# Altium integrated library LEMO Unipole And Multipole Type Connectors.IntLib: 1566 symbols (part 2 of 13) (continued)
## EDP.3M.322.XLN (continued)
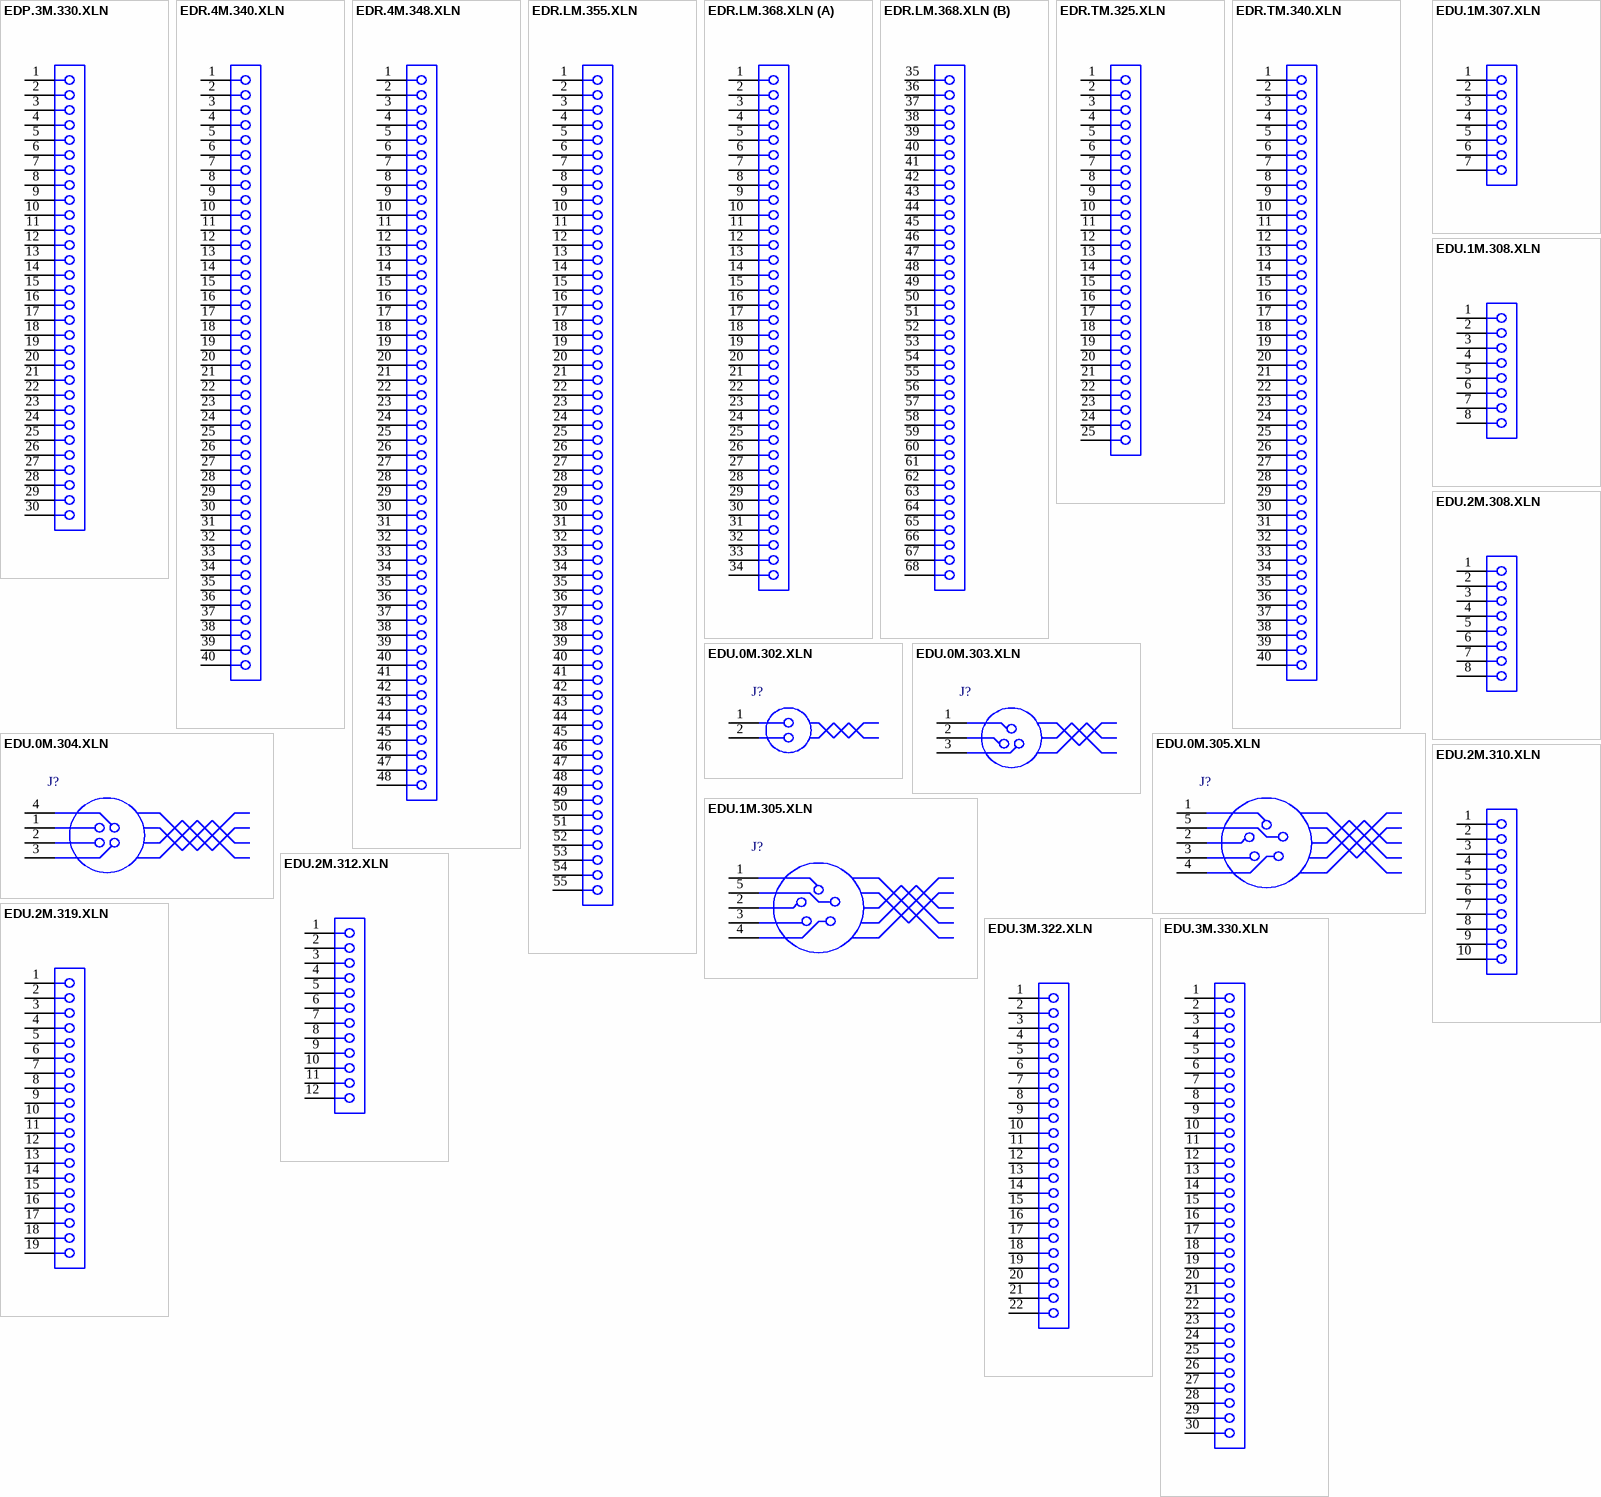
[diagram p6: symbols EDP.3M.330.XLN to EDU.3M.330.XLN]

## EDP.3M.330.XLN
designator J?
Fixed receptacle with square flange, Key (P), 3M series, Multipole Type with 30 Contacts; Manufacturer: LEMO; PartNumber: EDP.3M.330.XLN; Number of contacts: 30; Contact Diameter: 0.7 mm; AWG: 24; Rated Current(A): 3.5; DatasheetVersion: Jun-14; PackageReference: EDP.3M.330.XLN; PackageDescription: Fixed receptacle with square flange, Key(P) for Printed Circuit; ComponentLink1Description: Manufacturer URL; ComponentLink1URL: http://www.lemo.com; ComponentLink2Description: Datasheet; ComponentLink2URL: http://intra.lemo.ch/catalog/ROW/UK_English/M_series.pdf
footprint EDP.3M.330.XLN (Socket, Female, Height 22.1 mm, Through hole)
pins: 1, 2, 3, 4, 5, 6, 7, 8, 9, 10, 11, 12, 13, 14, 15, 16, 17, 18, 19, 20, 21, 22, 23, 24, 25, 26, 27, 28, 29, 30

## EDR.4M.340.XLN
designator J?
Fixed receptacle with square flange, Key (R), 4M series, Multipole Type with 40 Contacts; Manufacturer: LEMO; PartNumber: EDR.4M.340.XLN; Number of contacts: 40; Contact Diameter: 0.7 mm; AWG: 24; Rated Current(A): 3.5; DatasheetVersion: Jun-14; PackageReference: EDR.4M.340.XLN; PackageDescription: Fixed receptacle with square flange, Key(R) for Printed Circuit; ComponentLink1Description: Manufacturer URL; ComponentLink1URL: http://www.lemo.com; ComponentLink2Description: Datasheet; ComponentLink2URL: http://intra.lemo.ch/catalog/ROW/UK_English/M_series.pdf
footprint EDR.4M.340.XLN (Socket, Female, Through hole)
pins: 1, 2, 3, 4, 5, 6, 7, 8, 9, 10, 11, 12, 13, 14, 15, 16, 17, 18, 19, 20, 21, 22, 23, 24, 25, 26, 27, 28, 29, 30, 31, 32, 33, 34, 35, 36, 37, 38, 39, 40

## EDR.4M.348.XLN
designator J?
Fixed receptacle with square flange, Key (R), 4M series, Multipole Type with 48 Contacts; Manufacturer: LEMO; PartNumber: EDR.4M.348.XLN; Number of contacts: 48; Contact Diameter: 0.7 mm; AWG: 24; Rated Current(A): 3; DatasheetVersion: Jun-14; PackageReference: EDR.4M.348.XLN; PackageDescription: Fixed receptacle with square flange, Key(R) for Printed Circuit; ComponentLink1Description: Manufacturer URL; ComponentLink1URL: http://www.lemo.com; ComponentLink2Description: Datasheet; ComponentLink2URL: http://intra.lemo.ch/catalog/ROW/UK_English/M_series.pdf
footprint EDR.4M.348.XLN (Socket, Female, Through hole)
pins: 1, 2, 3, 4, 5, 6, 7, 8, 9, 10, 11, 12, 13, 14, 15, 16, 17, 18, 19, 20, 21, 22, 23, 24, 25, 26, 27, 28, 29, 30, 31, 32, 33, 34, 35, 36, 37, 38, 39, 40, 41, 42, 43, 44, 45, 46, 47, 48

## EDR.LM.355.XLN
designator J?
Fixed receptacle with square flange, Key (R), LM series, Multipole Type with; Manufacturer: LEMO; PartNumber: EDR.LM.355.XLN; Number of contacts: 0; Contact Diameter: 0.9 mm; Rated Current(A): 3.5; DatasheetVersion: Jun-14; PackageReference: EDR.LM.355.XLN; PackageDescription: Fixed receptacle with square flange, Key(R) for Printed Circuit; AWG: 0; ComponentLink1Description: Manufacturer URL; ComponentLink1URL: http://www.lemo.com; ComponentLink2Description: Datasheet; ComponentLink2URL: http://intra.lemo.ch/catalog/ROW/UK_English/M_series.pdf
footprint EDR.LM.355.XLN (Socket, Female, Height 28.5 mm, Through hole)
pins: 1, 2, 3, 4, 5, 6, 7, 8, 9, 10, 11, 12, 13, 14, 15, 16, 17, 18, 19, 20, 21, 22, 23, 24, 25, 26, 27, 28, 29, 30, 31, 32, 33, 34, 35, 36, 37, 38, 39, 40, 41, 42, 43, 44, 45, 46, 47, 48, 49, 50, 51, 52, 53, 54, 55

## EDR.LM.368.XLN
designator J?
Fixed receptacle with square flange, Key (R), LM series, Multipole Type with; Manufacturer: LEMO; PartNumber: EDR.LM.368.XLN; Number of contacts: 0; Contact Diameter: 0.7 mm; AWG: 24; Rated Current(A): 2.5; DatasheetVersion: Jun-14; PackageReference: EDR.LM.368.XLN; PackageDescription: Fixed receptacle with square flange, Key(R) for Printed Circuit; ComponentLink1Description: Manufacturer URL; ComponentLink1URL: http://www.lemo.com; ComponentLink2Description: Datasheet; ComponentLink2URL: http://intra.lemo.ch/catalog/ROW/UK_English/M_series.pdf
footprint EDR.LM.368.XLN (Socket, Female, Height 28.5 mm, Through hole)
part A pins: 1, 2, 3, 4, 5, 6, 7, 8, 9, 10, 11, 12, 13, 14, 15, 16, 17, 18, 19, 20, 21, 22, 23, 24, 25, 26, 27, 28, 29, 30, 31, 32, 33, 34
part B pins: 35, 36, 37, 38, 39, 40, 41, 42, 43, 44, 45, 46, 47, 48, 49, 50, 51, 52, 53, 54, 55, 56, 57, 58, 59, 60, 61, 62, 63, 64, 65, 66, 67, 68

## EDR.TM.325.XLN
designator J?
Fixed receptacle with square flange, Key (R), TM series, Multipole Type with 25 Contacts; Manufacturer: LEMO; PartNumber: EDR.TM.325.XLN; Number of contacts: 25; Contact Diameter: 0.9 mm; AWG: 0; Rated Current(A): 5; DatasheetVersion: Jun-14; PackageReference: EDR.TM.325.XLN; PackageDescription: Fixed receptacle with square flange, Key(R) for Printed Circuit; ComponentLink1Description: Manufacturer URL; ComponentLink1URL: http://www.lemo.com; ComponentLink2Description: Datasheet; ComponentLink2URL: http://intra.lemo.ch/catalog/ROW/UK_English/M_series.pdf
footprint EDR.TM.325.XLN (Socket, Female, Height 23.8 mm, Through hole)
pins: 1, 2, 3, 4, 5, 6, 7, 8, 9, 10, 11, 12, 13, 14, 15, 16, 17, 18, 19, 20, 21, 22, 23, 24, 25

## EDR.TM.340.XLN
designator J?
Fixed receptacle with square flange, Key (R), TM series, Multipole Type with 40 Contacts; Manufacturer: LEMO; PartNumber: EDR.TM.340.XLN; Number of contacts: 40; Contact Diameter: 0.7 mm; AWG: 0; Rated Current(A): 3; DatasheetVersion: Jun-14; PackageReference: EDR.TM.340.XLN; PackageDescription: Fixed receptacle with square flange, Key(R) for Printed Circuit; ComponentLink1Description: Manufacturer URL; ComponentLink1URL: http://www.lemo.com; ComponentLink2Description: Datasheet; ComponentLink2URL: http://intra.lemo.ch/catalog/ROW/UK_English/M_series.pdf
footprint EDR.TM.340.XLN (Socket, Female, Height 23.8 mm, Through hole)
pins: 1, 2, 3, 4, 5, 6, 7, 8, 9, 10, 11, 12, 13, 14, 15, 16, 17, 18, 19, 20, 21, 22, 23, 24, 25, 26, 27, 28, 29, 30, 31, 32, 33, 34, 35, 36, 37, 38, 39, 40

## EDU.0M.302.XLN
designator J?
Fixed receptacle with square flange, Key (U), 0M series, Multipole Type with 2 Contacts; Manufacturer: LEMO; PartNumber: EDU.0M.302.XLN; Number of contacts: 2; Contact Diameter: 0.9 mm; AWG: 22; Rated Current(A): 10; DatasheetVersion: Jun-14; PackageReference: EDU.0M.302.XLN; PackageDescription: Fixed receptacle with square flange, Key(U) for Printed Circuit; ComponentLink1Description: Manufacturer URL; ComponentLink1URL: http://www.lemo.com; ComponentLink2Description: Datasheet; ComponentLink2URL: http://intra.lemo.ch/catalog/ROW/UK_English/M_series.pdf
footprint EDU.0M.302.XLN (Socket, Female, Height 16 mm, Through hole)
pins: 1, 2

## EDU.0M.303.XLN
designator J?
Fixed receptacle with square flange, Key (U), 0M series, Multipole Type with 3 Contacts; Manufacturer: LEMO; PartNumber: EDU.0M.303.XLN; Number of contacts: 3; Contact Diameter: 0.9 mm; AWG: 22; Rated Current(A): 8; DatasheetVersion: Jun-14; PackageReference: EDU.0M.303.XLN; PackageDescription: Fixed receptacle with square flange, Key(U) for Printed Circuit; ComponentLink1Description: Manufacturer URL; ComponentLink1URL: http://www.lemo.com; ComponentLink2Description: Datasheet; ComponentLink2URL: http://intra.lemo.ch/catalog/ROW/UK_English/M_series.pdf
footprint EDU.0M.303.XLN (Socket, Female, Height 16 mm, Through hole)
pins: 1, 2, 3

## EDU.0M.304.XLN
designator J?
Fixed receptacle with square flange, Key (U), 0M series, Multipole Type with 4 Contacts; Manufacturer: LEMO; PartNumber: EDU.0M.304.XLN; Number of contacts: 4; Contact Diameter: 0.7 mm; AWG: 24; Rated Current(A): 7; DatasheetVersion: Jun-14; PackageReference: EDU.0M.304.XLN; PackageDescription: Fixed receptacle with square flange, Key(U) for Printed Circuit; ComponentLink1Description: Manufacturer URL; ComponentLink1URL: http://www.lemo.com; ComponentLink2Description: Datasheet; ComponentLink2URL: http://intra.lemo.ch/catalog/ROW/UK_English/M_series.pdf
footprint EDU.0M.304.XLN (Socket, Female, Height 16 mm, Through hole)
pins: 1, 2, 3, 4

## EDU.0M.305.XLN
designator J?
Fixed receptacle with square flange, Key (U), 0M series, Multipole Type with 5 Contacts; Manufacturer: LEMO; PartNumber: EDU.0M.305.XLN; Number of contacts: 5; Contact Diameter: 0.7 mm; AWG: 24; Rated Current(A): 6.5; DatasheetVersion: Jun-14; PackageReference: EDU.0M.305.XLN; PackageDescription: Fixed receptacle with square flange, Key(U) for Printed Circuit; ComponentLink1Description: Manufacturer URL; ComponentLink1URL: http://www.lemo.com; ComponentLink2Description: Datasheet; ComponentLink2URL: http://intra.lemo.ch/catalog/ROW/UK_English/M_series.pdf
footprint EDU.0M.305.XLN (Socket, Female, Height 16 mm, Through hole)
pins: 1, 2, 3, 4, 5

## EDU.1M.305.XLN
designator J?
Fixed receptacle with square flange, Key (U), 1M series, Multipole Type with 5 Contacts; Manufacturer: LEMO; PartNumber: EDU.1M.305.XLN; Number of contacts: 5; Contact Diameter: 0.9 mm; AWG: 22; Rated Current(A): 9; DatasheetVersion: Jun-14; PackageReference: EDU.1M.305.XLN; PackageDescription: Fixed receptacle with square flange, Key(U) for Printed Circuit; ComponentLink1Description: Manufacturer URL; ComponentLink1URL: http://www.lemo.com; ComponentLink2Description: Datasheet; ComponentLink2URL: http://intra.lemo.ch/catalog/ROW/UK_English/M_series.pdf
footprint EDU.1M.305.XLN (Socket, Female, Height 18.4 mm, Through hole)
pins: 1, 2, 3, 4, 5

## EDU.1M.307.XLN
designator J?
Fixed receptacle with square flange, Key (U), 1M series, Multipole Type with 7 Contacts; Manufacturer: LEMO; PartNumber: EDU.1M.307.XLN; Number of contacts: 7; Contact Diameter: 0.7 mm; AWG: 24; DatasheetVersion: Jun-14; PackageReference: EDU.1M.307.XLN; PackageDescription: Fixed receptacle with square flange, Key(U) for Printed Circuit; Rated Current(A): 7; ComponentLink1Description: Manufacturer URL; ComponentLink1URL: http://www.lemo.com; ComponentLink2Description: Datasheet; ComponentLink2URL: http://intra.lemo.ch/catalog/ROW/UK_English/M_series.pdf
footprint EDU.1M.307.XLN (Socket, Female, Height 18.4 mm, Through hole)
pins: 1, 2, 3, 4, 5, 6, 7

## EDU.1M.308.XLN
designator J?
Fixed receptacle with square flange, Key (U), 1M series, Multipole Type with 8 Contacts; Manufacturer: LEMO; PartNumber: EDU.1M.308.XLN; Number of contacts: 8; Contact Diameter: 0.7 mm; AWG: 24; Rated Current(A): 5; DatasheetVersion: Jun-14; PackageReference: EDU.1M.308.XLN; PackageDescription: Fixed receptacle with square flange, Key(U) for Printed Circuit; ComponentLink1Description: Manufacturer URL; ComponentLink1URL: http://www.lemo.com; ComponentLink2Description: Datasheet; ComponentLink2URL: http://intra.lemo.ch/catalog/ROW/UK_English/M_series.pdf
footprint EDU.1M.308.XLN (Socket, Female, Height 18.4 mm, Through hole)
pins: 1, 2, 3, 4, 5, 6, 7, 8

## EDU.2M.308.XLN
designator J?
Fixed receptacle with square flange, Key (U), 2M series, Multipole Type with 8 Contacts; Manufacturer: LEMO; PartNumber: EDU.2M.308.XLN; Number of contacts: 8; Contact Diameter: 0.9 mm; AWG: 22; Rated Current(A): 10; DatasheetVersion: Jun-14; PackageReference: EDU.2M.308.XLN; PackageDescription: Fixed receptacle with square flange, Key(U) for Printed Circuit; ComponentLink1Description: Manufacturer URL; ComponentLink1URL: http://www.lemo.com; ComponentLink2Description: Datasheet; ComponentLink2URL: http://intra.lemo.ch/catalog/ROW/UK_English/M_series.pdf
footprint EDU.2M.308.XLN (Socket, Female, Height 20.6 mm, Through hole)
pins: 1, 2, 3, 4, 5, 6, 7, 8

## EDU.2M.310.XLN
designator J?
Fixed receptacle with square flange, Key (U), 2M series, Multipole Type with 10 Contacts; Manufacturer: LEMO; PartNumber: EDU.2M.310.XLN; Number of contacts: 10; Contact Diameter: 0.9 mm; AWG: 22; Rated Current(A): 8; DatasheetVersion: Jun-14; PackageReference: EDU.2M.310.XLN; PackageDescription: Fixed receptacle with square flange, Key(U) for Printed Circuit; ComponentLink1Description: Manufacturer URL; ComponentLink1URL: http://www.lemo.com; ComponentLink2Description: Datasheet; ComponentLink2URL: http://intra.lemo.ch/catalog/ROW/UK_English/M_series.pdf
footprint EDU.2M.310.XLN (Socket, Female, Height 20.6 mm, Through hole)
pins: 1, 2, 3, 4, 5, 6, 7, 8, 9, 10

## EDU.2M.312.XLN
designator J?
Fixed receptacle with square flange, Key (U), 2M series, Multipole Type with 12 Contacts; Manufacturer: LEMO; PartNumber: EDU.2M.312.XLN; Number of contacts: 12; Contact Diameter: 0.7 mm; AWG: 24; Rated Current(A): 7; DatasheetVersion: Jun-14; PackageReference: EDU.2M.312.XLN; PackageDescription: Fixed receptacle with square flange, Key(U) for Printed Circuit; ComponentLink1Description: Manufacturer URL; ComponentLink1URL: http://www.lemo.com; ComponentLink2Description: Datasheet; ComponentLink2URL: http://intra.lemo.ch/catalog/ROW/UK_English/M_series.pdf
footprint EDU.2M.312.XLN (Socket, Female, Height 20.6 mm, Through hole)
pins: 1, 2, 3, 4, 5, 6, 7, 8, 9, 10, 11, 12

## EDU.2M.319.XLN
designator J?
Fixed receptacle with square flange, Key (U), 2M series, Multipole Type with 19 Contacts; Manufacturer: LEMO; PartNumber: EDU.2M.319.XLN; Number of contacts: 19; Contact Diameter: 0.7 mm; AWG: 24; Rated Current(A): 5; DatasheetVersion: Jun-14; PackageReference: EDU.2M.319.XLN; PackageDescription: Fixed receptacle with square flange, Key(U) for Printed Circuit; ComponentLink1Description: Manufacturer URL; ComponentLink1URL: http://www.lemo.com; ComponentLink2Description: Datasheet; ComponentLink2URL: http://intra.lemo.ch/catalog/ROW/UK_English/M_series.pdf
footprint EDU.2M.319.XLN (Socket, Female, Height 20.6 mm, Through hole)
pins: 1, 2, 3, 4, 5, 6, 7, 8, 9, 10, 11, 12, 13, 14, 15, 16, 17, 18, 19

## EDU.3M.322.XLN
designator J?
Fixed receptacle with square flange, Key (U), 3M series, Multipole Type with 22 Contacts; Manufacturer: LEMO; PartNumber: EDU.3M.322.XLN; Number of contacts: 22; Contact Diameter: 0.7 mm; AWG: 24; Rated Current(A): 4; DatasheetVersion: Jun-14; PackageReference: EDU.3M.322.XLN; PackageDescription: Fixed receptacle with square flange, Key(U) for Printed Circuit; ComponentLink1Description: Manufacturer URL; ComponentLink1URL: http://www.lemo.com; ComponentLink2Description: Datasheet; ComponentLink2URL: http://intra.lemo.ch/catalog/ROW/UK_English/M_series.pdf
footprint EDU.3M.322.XLN (Socket, Female, Height 22.1 mm, Through hole)
pins: 1, 2, 3, 4, 5, 6, 7, 8, 9, 10, 11, 12, 13, 14, 15, 16, 17, 18, 19, 20, 21, 22

## EDU.3M.330.XLN
designator J?
Fixed receptacle with square flange, Key (U), 3M series, Multipole Type with 30 Contacts; Manufacturer: LEMO; PartNumber: EDU.3M.330.XLN; Number of contacts: 30; Contact Diameter: 0.7 mm; AWG: 24; Rated Current(A): 3.5; DatasheetVersion: Jun-14; PackageReference: EDU.3M.330.XLN; PackageDescription: Fixed receptacle with square flange, Key(U) for Printed Circuit; ComponentLink1Description: Manufacturer URL; ComponentLink1URL: http://www.lemo.com; ComponentLink2Description: Datasheet; ComponentLink2URL: http://intra.lemo.ch/catalog/ROW/UK_English/M_series.pdf
footprint EDU.3M.330.XLN (Socket, Female, Height 22.1 mm, Through hole)
pins: 1, 2, 3, 4, 5, 6, 7, 8, 9, 10, 11, 12, 13, 14, 15, 16, 17, 18, 19, 20, 21, 22, 23, 24, 25, 26, 27, 28, 29, 30

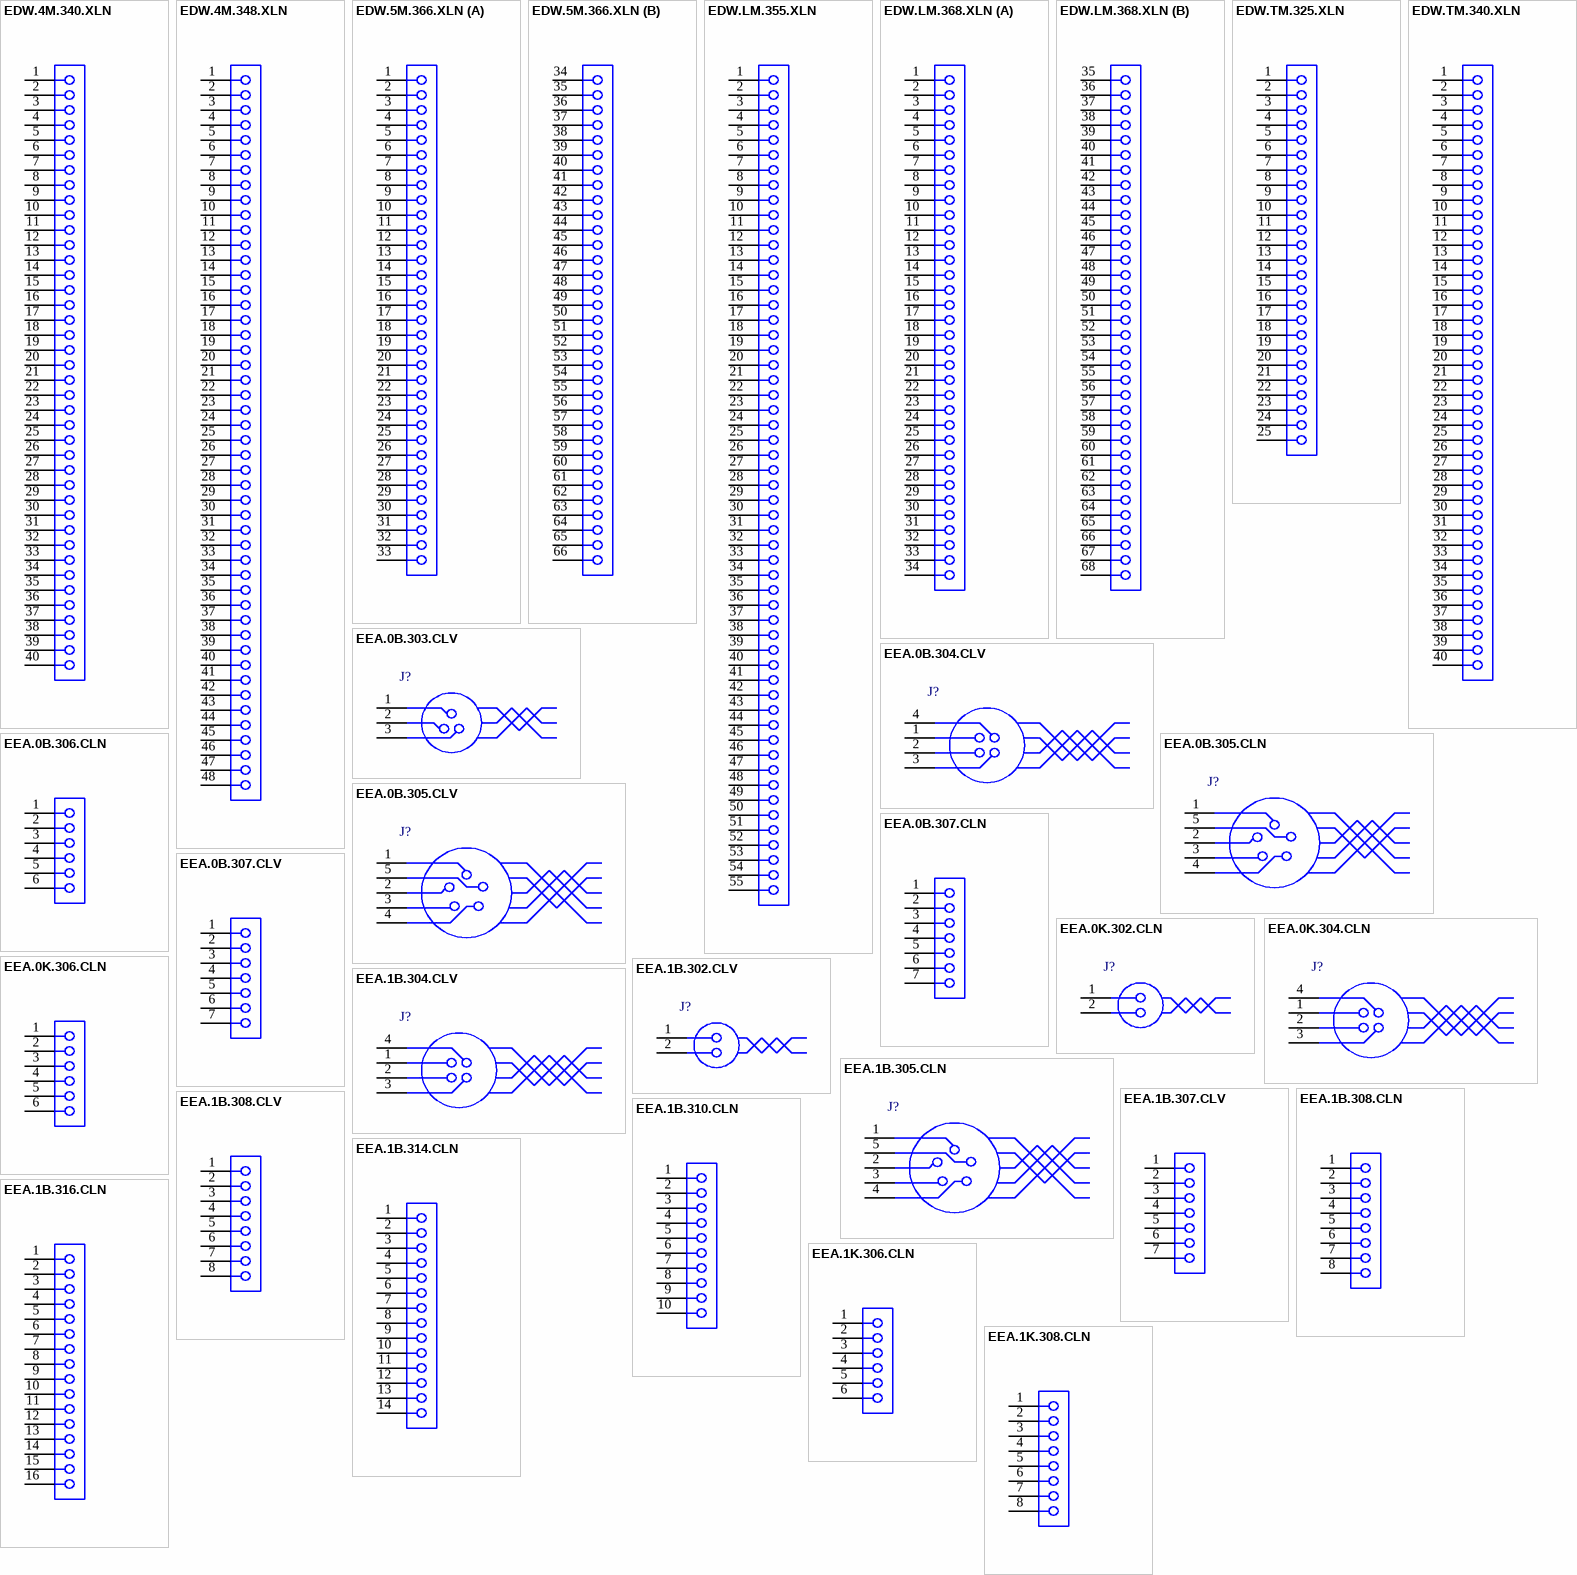
[diagram p7: symbols EDW.4M.340.XLN to EEA.1K.308.CLN]

## EDW.4M.340.XLN
designator J?
Fixed receptacle with square flange, Key (W), 4M series, Multipole Type with 40 Contacts; Manufacturer: LEMO; PartNumber: EDW.4M.340.XLN; Number of contacts: 40; Contact Diameter: 0.7 mm; AWG: 24; Rated Current(A): 3.5; DatasheetVersion: Jun-14; PackageReference: EDW.4M.340.XLN; PackageDescription: Fixed receptacle with square flange, Key(W) for Printed Circuit; ComponentLink1Description: Manufacturer URL; ComponentLink1URL: http://www.lemo.com; ComponentLink2Description: Datasheet; ComponentLink2URL: http://intra.lemo.ch/catalog/ROW/UK_English/M_series.pdf
footprint EDW.4M.340.XLN (Socket, Female, Through hole)
pins: 1, 2, 3, 4, 5, 6, 7, 8, 9, 10, 11, 12, 13, 14, 15, 16, 17, 18, 19, 20, 21, 22, 23, 24, 25, 26, 27, 28, 29, 30, 31, 32, 33, 34, 35, 36, 37, 38, 39, 40

## EDW.4M.348.XLN
designator J?
Fixed receptacle with square flange, Key (W), 4M series, Multipole Type with 48 Contacts; Manufacturer: LEMO; PartNumber: EDW.4M.348.XLN; Number of contacts: 48; Contact Diameter: 0.7 mm; AWG: 24; Rated Current(A): 3; DatasheetVersion: Jun-14; PackageReference: EDW.4M.348.XLN; PackageDescription: Fixed receptacle with square flange, Key(W) for Printed Circuit; ComponentLink1Description: Manufacturer URL; ComponentLink1URL: http://www.lemo.com; ComponentLink2Description: Datasheet; ComponentLink2URL: http://intra.lemo.ch/catalog/ROW/UK_English/M_series.pdf
footprint EDW.4M.348.XLN (Socket, Female, Through hole)
pins: 1, 2, 3, 4, 5, 6, 7, 8, 9, 10, 11, 12, 13, 14, 15, 16, 17, 18, 19, 20, 21, 22, 23, 24, 25, 26, 27, 28, 29, 30, 31, 32, 33, 34, 35, 36, 37, 38, 39, 40, 41, 42, 43, 44, 45, 46, 47, 48

## EDW.5M.366.XLN
designator J?
Fixed receptacle with square flange, Key (W), 5M series, Multipole Type with; Manufacturer: LEMO; PartNumber: EDW.5M.366.XLN; Number of contacts: 0; Contact Diameter: 0.9 mm; Rated Current(A): 3; DatasheetVersion: Jun-14; PackageReference: EDW.5M.366.XLN; PackageDescription: Fixed receptacle with square flange, Key(W) for Printed Circuit; AWG: 0; ComponentLink1Description: Manufacturer URL; ComponentLink1URL: http://www.lemo.com; ComponentLink2Description: Datasheet; ComponentLink2URL: http://intra.lemo.ch/catalog/ROW/UK_English/M_series.pdf
footprint EDW.5M.366.XLN (Socket, Female, Height 32.5 mm, Through hole)
part A pins: 1, 2, 3, 4, 5, 6, 7, 8, 9, 10, 11, 12, 13, 14, 15, 16, 17, 18, 19, 20, 21, 22, 23, 24, 25, 26, 27, 28, 29, 30, 31, 32, 33
part B pins: 34, 35, 36, 37, 38, 39, 40, 41, 42, 43, 44, 45, 46, 47, 48, 49, 50, 51, 52, 53, 54, 55, 56, 57, 58, 59, 60, 61, 62, 63, 64, 65, 66

## EDW.LM.355.XLN
designator J?
Fixed receptacle with square flange, Key (W), LM series, Multipole Type with; Manufacturer: LEMO; PartNumber: EDW.LM.355.XLN; Number of contacts: 0; Contact Diameter: 0.9 mm; Rated Current(A): 3.5; DatasheetVersion: Jun-14; PackageReference: EDW.LM.355.XLN; PackageDescription: Fixed receptacle with square flange, Key(W) for Printed Circuit; Supplier 1: Mouser; Supplier Part Number 1: 736-EDWLM355XLN; Supplier 2: Digi-Key; Supplier Part Number 2: EDW.LM.355.XLN-ND; AWG: 0; ComponentLink1Description: Manufacturer URL; ComponentLink1URL: http://www.lemo.com; ComponentLink2Description: Datasheet; ComponentLink2URL: http://intra.lemo.ch/catalog/ROW/UK_English/M_series.pdf
footprint EDW.LM.355.XLN (Socket, Female, Height 28.5 mm, Through hole)
pins: 1, 2, 3, 4, 5, 6, 7, 8, 9, 10, 11, 12, 13, 14, 15, 16, 17, 18, 19, 20, 21, 22, 23, 24, 25, 26, 27, 28, 29, 30, 31, 32, 33, 34, 35, 36, 37, 38, 39, 40, 41, 42, 43, 44, 45, 46, 47, 48, 49, 50, 51, 52, 53, 54, 55

## EDW.LM.368.XLN
designator J?
Fixed receptacle with square flange, Key (W), LM series, Multipole Type with; Manufacturer: LEMO; PartNumber: EDW.LM.368.XLN; Number of contacts: 0; Contact Diameter: 0.7 mm; AWG: 24; Rated Current(A): 2.5; DatasheetVersion: Jun-14; PackageReference: EDW.LM.368.XLN; PackageDescription: Fixed receptacle with square flange, Key(W) for Printed Circuit; Supplier 1: Mouser; Supplier Part Number 1: 736-EDWLM368XLN; Supplier 2: Digi-Key; Supplier Part Number 2: EDW.LM.368.XLN-ND; ComponentLink1Description: Manufacturer URL; ComponentLink1URL: http://www.lemo.com; ComponentLink2Description: Datasheet; ComponentLink2URL: http://intra.lemo.ch/catalog/ROW/UK_English/M_series.pdf
footprint EDW.LM.368.XLN (Socket, Female, Height 28.5 mm, Through hole)
part A pins: 1, 2, 3, 4, 5, 6, 7, 8, 9, 10, 11, 12, 13, 14, 15, 16, 17, 18, 19, 20, 21, 22, 23, 24, 25, 26, 27, 28, 29, 30, 31, 32, 33, 34
part B pins: 35, 36, 37, 38, 39, 40, 41, 42, 43, 44, 45, 46, 47, 48, 49, 50, 51, 52, 53, 54, 55, 56, 57, 58, 59, 60, 61, 62, 63, 64, 65, 66, 67, 68

## EDW.TM.325.XLN
designator J?
Fixed receptacle with square flange, Key (W), TM series, Multipole Type with 25 Contacts; Manufacturer: LEMO; PartNumber: EDW.TM.325.XLN; Number of contacts: 25; Contact Diameter: 0.9 mm; AWG: 0; Rated Current(A): 5; DatasheetVersion: Jun-14; PackageReference: EDW.TM.325.XLN; PackageDescription: Fixed receptacle with square flange, Key(W) for Printed Circuit; ComponentLink1Description: Manufacturer URL; ComponentLink1URL: http://www.lemo.com; ComponentLink2Description: Datasheet; ComponentLink2URL: http://intra.lemo.ch/catalog/ROW/UK_English/M_series.pdf
footprint EDW.TM.325.XLN (Socket, Female, Height 23.8 mm, Through hole)
pins: 1, 2, 3, 4, 5, 6, 7, 8, 9, 10, 11, 12, 13, 14, 15, 16, 17, 18, 19, 20, 21, 22, 23, 24, 25

## EDW.TM.340.XLN
designator J?
Fixed receptacle with square flange, Key (W), TM series, Multipole Type with 40 Contacts; Manufacturer: LEMO; PartNumber: EDW.TM.340.XLN; Number of contacts: 40; Contact Diameter: 0.7 mm; AWG: 0; Rated Current(A): 3; DatasheetVersion: Jun-14; PackageReference: EDW.TM.340.XLN; PackageDescription: Fixed receptacle with square flange, Key(W) for Printed Circuit; ComponentLink1Description: Manufacturer URL; ComponentLink1URL: http://www.lemo.com; ComponentLink2Description: Datasheet; ComponentLink2URL: http://intra.lemo.ch/catalog/ROW/UK_English/M_series.pdf
footprint EDW.TM.340.XLN (Socket, Female, Height 23.8 mm, Through hole)
pins: 1, 2, 3, 4, 5, 6, 7, 8, 9, 10, 11, 12, 13, 14, 15, 16, 17, 18, 19, 20, 21, 22, 23, 24, 25, 26, 27, 28, 29, 30, 31, 32, 33, 34, 35, 36, 37, 38, 39, 40

## EEA.0B.303.CLV
designator J?
Fixed receptacle, nut fixing with elbow contacts for printed circuit(back panel mounting), Key (A), 0B series, Multipole Type with 3 Contacts; Manufacturer: LEMO; PartNumber: EEA.0B.303.CLV; Number of contacts: 3; Contact Diameter: 0.9 mm; AWG: 22; Rated Current(A): 6; DatasheetVersion: Jun-14; PackageReference: EEA.0B.303.CLV; PackageDescription: Fixed receptacle, nut fixing with elbow contacts for printed circuit(back panel mounting), Key(A) for Printed Circuit; ComponentLink1Description: Manufacturer URL; ComponentLink1URL: http://www.lemo.com; ComponentLink2Description: Datasheet; ComponentLink2URL: http://intra.lemo.ch/catalog/ROW/UK_English/unipole_multipole.pdf
footprint EEA.0B.303.CLV (Socket, Female, Body 9mm dia. Height 19.1 mm, Through hole)
pins: 1, 2, 3

## EEA.0B.304.CLV
designator J?
Fixed receptacle, nut fixing with elbow contacts for printed circuit(back panel mounting), Key (A), 0B series, Multipole Type with 4 Contacts; Manufacturer: LEMO; PartNumber: EEA.0B.304.CLV; Number of contacts: 4; Contact Diameter: 0.7 mm; AWG: 24; Rated Current(A): 6; DatasheetVersion: Jun-14; PackageReference: EEA.0B.304.CLV; PackageDescription: Fixed receptacle, nut fixing with elbow contacts for printed circuit(back panel mounting), Key(A) for Printed Circuit; Supplier 1: Mouser; Supplier Part Number 1: 736-EEA0B304CLV; Supplier 2: Digi-Key; Supplier Part Number 2: EEA.0B.304.CLV-ND; ComponentLink1Description: Manufacturer URL; ComponentLink1URL: http://www.lemo.com; ComponentLink2Description: Datasheet; ComponentLink2URL: http://intra.lemo.ch/catalog/ROW/UK_English/unipole_multipole.pdf
footprint EEA.0B.304.CLV (Socket, Female, Body 9mm dia. Height 19.1 mm, Through hole)
pins: 1, 2, 3, 4

## EEA.0B.305.CLN
designator J?
Fixed receptacle, nut fixing with straight contacts for printed circuit(back panel mounting), Key (A), 0B series, Multipole Type with 5 Contacts; Manufacturer: LEMO; PartNumber: EEA.0B.305.CLN; Number of contacts: 5; Contact Diameter: 0.7 mm; AWG: 24; Rated Current(A): 6.5; DatasheetVersion: Jun-14; PackageReference: EEA.0B.305.CLN; PackageDescription: Fixed receptacle, nut fixing with straight contacts for printed circuit(back panel mounting), Key(A) for Printed Circuit; Supplier 1: Mouser; Supplier Part Number 1: 736-EEA0B305CLN; Supplier 2: Newark; Supplier Part Number 2: 19X4935; Supplier 3: Digi-Key; Supplier Part Number 3: EEA.0B.305.CLN-ND; ComponentLink1Description: Manufacturer URL; ComponentLink1URL: http://www.lemo.com; ComponentLink2Description: Datasheet; ComponentLink2URL: http://intra.lemo.ch/catalog/ROW/UK_English/unipole_multipole.pdf
footprint EEA.0B.305.CLN (Socket, Female, Body 9mm dia. Height 16.3 mm, Through hole)
pins: 1, 2, 3, 4, 5

## EEA.0B.305.CLV
designator J?
Fixed receptacle, nut fixing with elbow contacts for printed circuit(back panel mounting), Key (A), 0B series, Multipole Type with 5 Contacts; Manufacturer: LEMO; PartNumber: EEA.0B.305.CLV; Number of contacts: 5; Contact Diameter: 0.7 mm; AWG: 24; Rated Current(A): 6; DatasheetVersion: Jun-14; PackageReference: EEA.0B.305.CLV; PackageDescription: Fixed receptacle, nut fixing with elbow contacts for printed circuit(back panel mounting), Key(A) for Printed Circuit; Supplier 1: Mouser; Supplier Part Number 1: 736-EEA0B305CLV; Supplier 2: Digi-Key; Supplier Part Number 2: EEA.0B.305.CLV-ND; ComponentLink1Description: Manufacturer URL; ComponentLink1URL: http://www.lemo.com; ComponentLink2Description: Datasheet; ComponentLink2URL: http://intra.lemo.ch/catalog/ROW/UK_English/unipole_multipole.pdf
footprint EEA.0B.305.CLV (Socket, Female, Body 9mm dia. Height 19.1 mm, Through hole)
pins: 1, 2, 3, 4, 5

## EEA.0B.306.CLN
designator J?
Fixed receptacle, nut fixing with straight contacts for printed circuit(back panel mounting), Key (A), 0B series, Multipole Type with 6 Contacts; Manufacturer: LEMO; PartNumber: EEA.0B.306.CLN; Number of contacts: 6; Contact Diameter: 0.5 mm; AWG: 28; Rated Current(A): 2.5; DatasheetVersion: Jun-14; PackageReference: EEA.0B.306.CLN; PackageDescription: Fixed receptacle, nut fixing with straight contacts for printed circuit(back panel mounting), Key(A) for Printed Circuit; Supplier 1: Mouser; Supplier Part Number 1: 736-EEA0B306CLN; Supplier 2: Digi-Key; Supplier Part Number 2: EEA.0B.306.CLN-ND; ComponentLink1Description: Manufacturer URL; ComponentLink1URL: http://www.lemo.com; ComponentLink2Description: Datasheet; ComponentLink2URL: http://intra.lemo.ch/catalog/ROW/UK_English/unipole_multipole.pdf
footprint EEA.0B.306.CLN (Socket, Female, Body 9mm dia. Height 16.3 mm, Through hole)
pins: 1, 2, 3, 4, 5, 6